# Altium footprint library ubloxLib.PcbLib: 20 footprints (part 1 of 2)
Each footprint in its own frame and in the unit in brackets; x right, y up, seen from the top. Pads: shape width x height; smd on the part's side, far side on the other; paste and mask are expansions set on the pad; w line width, h text height; cw(c..) or ccw(c..) is an arc to the next point about the centre after c.
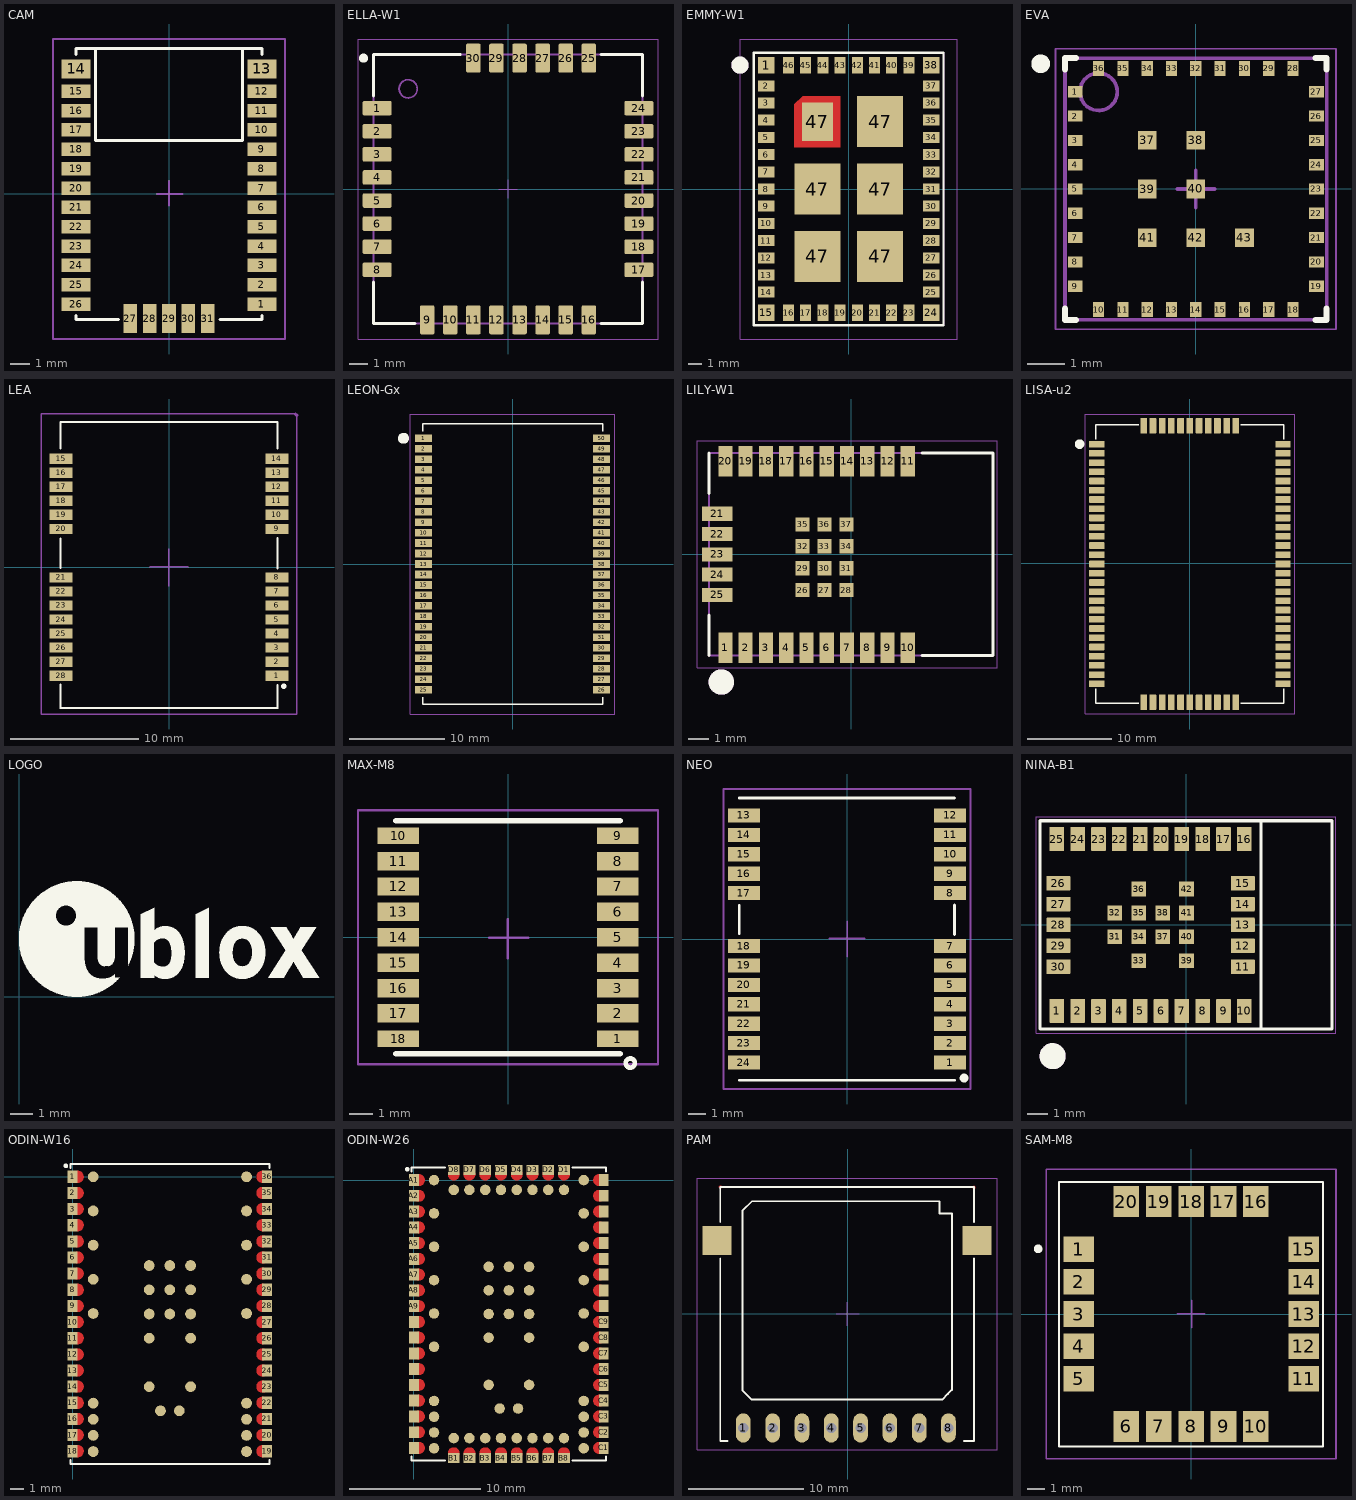
[diagram p0: the footprints below, top view; thin cyan lines are the x and y axes]

## CAM [mm] "u-blox CAM GNSS antenna module"
pads (31):
  rect 1.5x0.7 smd: 1(4.8,-5.7) 2(4.8,-4.7) 3(4.8,-3.7) 4(4.8,-2.7) 5(4.8,-1.7) 6(4.8,-0.7) 7(4.8,0.3) 8(4.8,1.3) 9(4.8,2.3) 10(4.8,3.3) 11(4.8,4.3) 12(4.8,5.3) 15(-4.8,5.3) 16(-4.8,4.3) 17(-4.8,3.3) 18(-4.8,2.3) 19(-4.8,1.3) 20(-4.8,0.3) 21(-4.8,-0.7) 22(-4.8,-1.7) 23(-4.8,-2.7) 24(-4.8,-3.7) 25(-4.8,-4.7) 26(-4.8,-5.7)
  rect 1.5x1 smd: 13(4.8,6.45) 14(-4.8,6.45)
  rect 0.7x1.5 smd: 27(-2,-6.45) 28(-1,-6.45) 29(0,-6.45) 30(1,-6.45) 31(2,-6.45)
Top Overlay:
  lines w0.16: -4.8,-6.3 -4.8,-6.5 -2.6,-6.5 ; -4.8,7.2 -4.8,7.5 4.8,7.5 4.8,7.2 ; -3.8,7.5 -3.8,2.75 3.8,2.75 3.8,7.5 ; 2.63,-6.5 4.45,-6.5 4.8,-6.5 4.8,-6.3
Mechanical 13:
  text ".Designator" at -3.818,9.56 h1
Mechanical 15:
  lines w0.1: -0.619,-0.003 -0.001,-0.003 ; -0.001,-0.615 -0.001,-0.003 ; -0.001,0.662 -0.001,-0.003 ; 0.696,-0.003 -0.001,-0.003 ; -6,-7.5 -6,8 6,8 6,-7.5 -6,-7.5
Multi-Layer:
  pour cut-out: -3.8,7.5 -3.8,2.75 3.8,2.75 3.8,7.5
3D body "CAM (STEP-AP214).STEP": height 1.97, standoff -0.04, extent -4.8,-6.5 4.8,7.5

## ELLA-W1 [mm] "IEEE 802.11a/b/g/n Wi-Fi, Bluetooth 3.0+HS Module"
height 2
pads (30):
  rrect25% 1.6x0.8 smd: 1(-7.2,4.445) 2(-7.2,3.175) 3(-7.2,1.905) 4(-7.2,0.635) 5(-7.2,-0.635) 6(-7.2,-1.905) 7(-7.2,-3.175) 8(-7.2,-4.445) 17(7.2,-4.445) 18(7.2,-3.175) 19(7.2,-1.905) 20(7.2,-0.635) 21(7.2,0.635) 22(7.2,1.905) 23(7.2,3.175) 24(7.2,4.445)
  rrect25% 0.8x1.6 smd: 9(-4.445,-7.2) 10(-3.175,-7.2) 11(-1.905,-7.2) 12(-0.635,-7.2) 13(0.635,-7.2) 14(1.905,-7.2) 15(3.175,-7.2) 16(4.445,-7.2) 25(4.445,7.2) 26(3.175,7.2) 27(1.905,7.2) 28(0.635,7.2) 29(-0.635,7.2) 30(-1.905,7.2)
Top Overlay:
  circle w0.4: c-7.95,7.2 r0.05
  lines w0.16: -7.4,-5.125 -7.4,-7.4 -5.125,-7.4 ; -7.4,5.125 -7.4,7.4 -2.625,7.4 ; 5.125,-7.4 7.4,-7.4 7.4,-5.125 ; 5.125,7.4 7.4,7.4 7.4,5.125
Mechanical 13:
  circle w0.1: c-5.489,5.512 r0.499
  lines w0.1: -7.4,4.695 -7.4,7.4 -2.155,7.4 ccw(c-1.905,7.4) -1.655,7.4 -0.885,7.4 ccw(c-0.635,7.4) -0.385,7.4 0.385,7.4 ccw(c0.635,7.4) 0.885,7.4 1.655,7.4 ccw(c1.905,7.4) 2.155,7.4 2.925,7.4 ccw(c3.175,7.4) 3.425,7.4 4.195,7.4 ccw(c4.445,7.4) 4.695,7.4 ; -7.4,4.695 cw(c-7.4,4.445) -7.4,4.195 -7.4,3.425 cw(c-7.4,3.175) -7.4,2.925 -7.4,2.155 cw(c-7.4,1.905) -7.4,1.655 -7.4,0.885 cw(c-7.4,0.635) -7.4,0.385 -7.4,-0.385 cw(c-7.4,-0.635) -7.4,-0.885 -7.4,-1.655 cw(c-7.4,-1.905) -7.4,-2.155 -7.4,-2.925 cw(c-7.4,-3.175) -7.4,-3.425 -7.4,-4.195 cw(c-7.4,-4.445) -7.4,-4.695 -7.4,-7.4 -4.695,-7.4 cw(c-4.445,-7.4) -4.195,-7.4 -3.425,-7.4 cw(c-3.175,-7.4) -2.925,-7.4 -2.155,-7.4 cw(c-1.905,-7.4) -1.655,-7.4 -0.885,-7.4 cw(c-0.635,-7.4) -0.385,-7.4 0.385,-7.4 cw(c0.635,-7.4) 0.885,-7.4 1.655,-7.4 cw(c1.905,-7.4) 2.155,-7.4 2.925,-7.4 cw(c3.175,-7.4) 3.425,-7.4 4.195,-7.4 cw(c4.445,-7.4) 4.695,-7.4 7.4,-7.4 7.4,-4.695 ; 4.694,7.4 7.4,7.4 7.4,4.695 ccw(c7.4,4.445) 7.4,4.195 7.4,3.425 ccw(c7.4,3.175) 7.4,2.925 7.4,2.155 ccw(c7.4,1.905) 7.4,1.655 7.4,0.885 ccw(c7.4,0.635) 7.4,0.385 7.4,-0.385 ccw(c7.4,-0.635) 7.4,-0.885 7.4,-1.655 ccw(c7.4,-1.905) 7.4,-2.155 7.4,-2.925 ccw(c7.4,-3.175) 7.4,-3.425 7.4,-4.195 ccw(c7.4,-4.445) 7.4,-4.695
  text ".Designator" at -7.4,8.7 h1
Mechanical 15:
  lines w0.05: -0.5,0 0.5,0 ; 0,-0.5 0,0.5 ; -8.25,-8.25 -8.25,8.25 8.25,8.25 8.25,-8.25 -8.25,-8.25
3D body: height 2.5, standoff 2.35, extent -7.2,-7.2 7.199,7.2
3D body: height 2.51, standoff 2.5, extent -5.999,5.01 -5.001,6.009
3D body: height 0.87, standoff 0.85, extent -7.3,6.1 -6.1,7.3
3D body: height 2.35, standoff 0.87, extent -7.1,6.2 -6.2,7.1
3D body: height 2.35, standoff 1.1, extent -6.15,7.05 6.15,7.2
3D body: height 2.35, standoff 0.87, extent 6.199,6.2 7.099,7.1
3D body: height 0.87, standoff 0.85, extent 6.099,6.1 7.299,7.3
3D body: height 2.35, standoff 0.87, extent 6.2,-7.1 7.1,-6.2
3D body: height 0.87, standoff 0.85, extent 6.1,-7.3 7.3,-6.1
3D body: height 2.35, standoff 0.87, extent -7.1,-7.1 -6.2,-6.2
3D body: height 0.87, standoff 0.85, extent -7.3,-7.3 -6.1,-6.1
3D body: height 2.35, standoff 1.1, extent -6.15,-7.2 6.15,-7.05
3D body: height 2.35, standoff 1.1, extent -7.2,-6.15 -7.05,6.15
3D body: height 2.35, standoff 1.1, extent 7.049,-6.15 7.199,6.15
3D body: height 0.85, standoff 0, extent -7.4,-7.4 7.4,7.4
3D body: height 0.87, standoff 0, extent -7.4,4.17 -7.125,4.72
3D body: height 0.87, standoff 0.85, extent -7.4,4.02 -6.975,4.87
3D body: height 0.87, standoff 0, extent -7.4,2.9 -7.125,3.45
3D body: height 0.87, standoff 0.85, extent -7.4,2.75 -6.975,3.6
3D body: height 0.87, standoff 0, extent -7.4,1.63 -7.125,2.18
3D body: height 0.87, standoff 0.85, extent -7.4,1.48 -6.975,2.33
3D body: height 0.87, standoff 0, extent -7.4,0.36 -7.125,0.91
3D body: height 0.87, standoff 0.85, extent -7.4,0.21 -6.975,1.06
3D body: height 0.87, standoff 0, extent -7.4,-0.91 -7.125,-0.36
3D body: height 0.87, standoff 0.85, extent -7.4,-1.06 -6.975,-0.21
3D body: height 0.87, standoff 0, extent -7.4,-2.18 -7.125,-1.63
3D body: height 0.87, standoff 0.85, extent -7.4,-2.33 -6.975,-1.48
3D body: height 0.87, standoff 0, extent -7.4,-3.45 -7.125,-2.9
3D body: height 0.87, standoff 0.85, extent -7.4,-3.6 -6.975,-2.75
3D body: height 0.87, standoff 0, extent -7.4,-4.72 -7.125,-4.17
3D body: height 0.87, standoff 0.85, extent -7.4,-4.87 -6.975,-4.02
3D body: height 0.87, standoff 0.85, extent 4.02,-7.4 4.87,-6.975
3D body: height 0.87, standoff 0, extent 4.17,-7.4 4.72,-7.125
3D body: height 0.87, standoff 0.85, extent 2.75,-7.4 3.6,-6.975
3D body: height 0.87, standoff 0, extent 2.9,-7.4 3.45,-7.125
3D body: height 0.87, standoff 0.85, extent 1.48,-7.4 2.33,-6.975
3D body: height 0.87, standoff 0, extent 1.63,-7.4 2.18,-7.125
3D body: height 0.87, standoff 0.85, extent 0.21,-7.4 1.06,-6.975
3D body: height 0.87, standoff 0, extent 0.36,-7.4 0.91,-7.125
3D body: height 0.87, standoff 0.85, extent -1.06,-7.4 -0.21,-6.975
3D body: height 0.87, standoff 0, extent -0.91,-7.4 -0.36,-7.125
3D body: height 0.87, standoff 0.85, extent -2.33,-7.4 -1.48,-6.975
3D body: height 0.87, standoff 0, extent -2.18,-7.4 -1.63,-7.125
3D body: height 0.87, standoff 0.85, extent -3.6,-7.4 -2.75,-6.975
3D body: height 0.87, standoff 0, extent -3.45,-7.4 -2.9,-7.125
3D body: height 0.87, standoff 0.85, extent -4.87,-7.4 -4.02,-6.975
3D body: height 0.87, standoff 0, extent -4.72,-7.4 -4.17,-7.125
3D body: height 0.87, standoff 0.85, extent 6.975,4.02 7.4,4.87
3D body: height 0.87, standoff 0, extent 7.125,4.17 7.4,4.72
3D body: height 0.87, standoff 0.85, extent 6.975,2.75 7.4,3.6
3D body: height 0.87, standoff 0, extent 7.125,2.9 7.4,3.45
3D body: height 0.87, standoff 0.85, extent 6.975,1.48 7.4,2.33
3D body: height 0.87, standoff 0, extent 7.125,1.63 7.4,2.18
3D body: height 0.87, standoff 0.85, extent 6.975,0.21 7.4,1.06
3D body: height 0.87, standoff 0, extent 7.125,0.36 7.4,0.91
3D body: height 0.87, standoff 0.85, extent 6.975,-1.06 7.4,-0.21
3D body: height 0.87, standoff 0, extent 7.125,-0.91 7.4,-0.36
3D body: height 0.87, standoff 0.85, extent 6.975,-2.33 7.4,-1.48
3D body: height 0.87, standoff 0, extent 7.125,-2.18 7.4,-1.63
3D body: height 0.87, standoff 0.85, extent 6.975,-3.6 7.4,-2.75
3D body: height 0.87, standoff 0, extent 7.125,-3.45 7.4,-2.9
3D body: height 0.87, standoff 0.85, extent 6.975,-4.87 7.4,-4.02
3D body: height 0.87, standoff 0, extent 7.125,-4.72 7.4,-4.17
3D body: height 0.87, standoff 0.85, extent -2.33,6.975 -1.48,7.4
3D body: height 0.87, standoff 0, extent -2.18,7.125 -1.63,7.4
3D body: height 0.87, standoff 0.85, extent -1.06,6.975 -0.21,7.4
3D body: height 0.87, standoff 0, extent -0.91,7.125 -0.36,7.4
3D body: height 0.87, standoff 0.85, extent 0.21,6.975 1.06,7.4
3D body: height 0.87, standoff 0, extent 0.36,7.125 0.91,7.4
3D body: height 0.87, standoff 0.85, extent 1.48,6.975 2.33,7.4
3D body: height 0.87, standoff 0, extent 1.63,7.125 2.18,7.4
3D body: height 0.87, standoff 0.85, extent 2.75,6.975 3.6,7.4
3D body: height 0.87, standoff 0, extent 2.9,7.125 3.45,7.4
3D body: height 0.87, standoff 0.85, extent 4.02,6.975 4.87,7.4
3D body: height 0.87, standoff 0, extent 4.17,7.125 4.72,7.4

## EMMY-W1 [mm] "Host-based multiradio module with Wi-Fi, Bluetooth and NFC"
height 2.5
pads (52):
  rect 1.2x1.2 smd: 1(-6,9) 15(-6,-9) 24(6,-9) 38(6,9)
  rect 1.2x0.8 smd: 2(-6,7.5) 3(-6,6.25) 4(-6,5) 5(-6,3.75) 6(-6,2.5) 7(-6,1.25) 8(-6,0) 9(-6,-1.25) 10(-6,-2.5) 11(-6,-3.75) 12(-6,-5) 13(-6,-6.25) 14(-6,-7.5) 25(6,-7.5) 26(6,-6.25) 27(6,-5) 28(6,-3.75) 29(6,-2.5) 30(6,-1.25) 31(6,0) 32(6,1.25) 33(6,2.5) 34(6,3.75) 35(6,5) 36(6,6.25) 37(6,7.5)
  rect 0.8x1.2 smd: 16(-4.375,-9) 17(-3.125,-9) 18(-1.875,-9) 19(-0.625,-9) 20(0.625,-9) 21(1.875,-9) 22(3.125,-9) 23(4.375,-9) 39(4.375,9) 40(3.125,9) 41(1.875,9) 42(0.625,9) 43(-0.625,9) 44(-1.875,9) 45(-3.125,9) 46(-4.375,9)
  rect 3.35x3.7 smd paste-10: 47(-2.275,-4.9) 47(-2.275,0) 47(2.275,-4.9) 47(2.275,0) 47(2.275,4.9)
  rect 2.25x2.8 smd paste-10: 47(-2.275,4.9)
Top Layer:
  region: -3.95,3.05 -0.6,3.05 -0.6,6.75 -3.35,6.75 -3.95,6.15
Top Overlay:
  circle w0.75: c-7.9,9 r0.25
  lines w0.15: -6.9,-9.9 -6.9,9.9 6.9,9.9 6.9,-9.9 -6.9,-9.9
Top Paste:
  drawing of 54 lines, arcs and shapes, not listed
Top Solder:
  region: -4.075,2.95 -0.5,2.95 -0.5,6.85 -3.425,6.85 -4.075,6.2
Mechanical 13:
  circle w0.75: c-7.9,9 r0.25
  lines w0.1: -6.9,-9.9 -6.9,9.9 6.9,9.9 6.9,-9.9 -6.9,-9.9
  text ".Designator" at -6.9,11.4 h1
Mechanical 15:
  lines w0.05: -7.9,-10.9 -7.9,10.9 7.9,10.9 7.9,-10.9 -7.9,-10.9
3D body: height 3, standoff 0, extent -6.925,-9.9 6.925,9.9

## EVA [mm] "u-blox EVA GNSS module"
height 1.16
pads (43):
  rect 0.4x0.3 smd: 1(-3.225,2.6) 2(-3.225,1.95) 3(-3.225,1.3) 4(-3.225,0.65) 5(-3.225,0) 6(-3.225,-0.65) 7(-3.225,-1.3) 8(-3.225,-1.95) 9(-3.225,-2.6) 19(3.225,-2.6) 20(3.225,-1.95) 21(3.225,-1.3) 22(3.225,-0.65) 23(3.225,0) 24(3.225,0.65) 25(3.225,1.3) 26(3.225,1.95) 27(3.225,2.6)
  rect 0.3x0.4 smd: 10(-2.6,-3.225) 11(-1.95,-3.225) 12(-1.3,-3.225) 13(-0.65,-3.225) 14(0,-3.225) 15(0.65,-3.225) 16(1.3,-3.225) 17(1.95,-3.225) 18(2.6,-3.225) 28(2.6,3.225) 29(1.95,3.225) 30(1.3,3.225) 31(0.65,3.225) 32(0,3.225) 33(-0.65,3.225) 34(-1.3,3.225) 35(-1.95,3.225) 36(-2.6,3.225)
  rect 0.5x0.5 smd paste+0: 37(-1.3,1.3) 38(0,1.3) 39(-1.3,0) 40(0,0) 41(-1.3,-1.3) 42(0,-1.3) 43(1.3,-1.3)
Top Overlay:
  circle w0.25: c-4.15,3.35 r0.125
  lines w0.16: -3.5,-3.2 -3.5,-3.5 -3.2,-3.5 ; -3.5,3.2 -3.5,3.5 -3.2,3.5 ; 3.2,-3.5 3.5,-3.5 3.5,-3.2 ; 3.2,3.5 3.5,3.5 3.5,3.2
Mechanical 13:
  circle w0.1: c-2.6,2.6 r0.5
  lines w0.1: -3.5,-3.5 -3.5,3.5 3.5,3.5 3.5,-3.5 -3.5,-3.5
  text ".Designator" at -3.291,4.285 h1
Mechanical 15:
  lines w0.05: -3.75,-3.75 -3.75,3.75 3.75,3.75 3.75,-3.75 -3.75,-3.75
  lines w0.1: -0.5,0 0.5,0 ; 0,-0.5 0,0.5
3D body "EVA-43 (STEP-AP214).STEP": height 1.07, standoff 0.01, extent -3.499,-3.499 3.501,3.501

## LEA [mm] "u-blox LEA GNSS module"
pads (28):
  rect 1.8x0.8 smd paste-4: 1(8.445,-8.5)
  rect 1.8x0.8 smd paste-0.4 mask+0.102: 2(8.445,-7.4) 3(8.445,-6.3) 4(8.445,-5.2) 5(8.445,-4.1) 6(8.445,-3) 7(8.445,-1.9) 8(8.445,-0.8) 9(8.445,3) 10(8.445,4.1) 11(8.445,5.2) 12(8.445,6.3) 13(8.445,7.4) 14(8.445,8.5) 16(-8.445,7.4) 17(-8.445,6.3) 18(-8.445,5.2) 19(-8.445,4.1) 20(-8.445,3) 21(-8.445,-0.8) 22(-8.445,-1.9) 23(-8.445,-3) 24(-8.445,-4.1) 25(-8.445,-5.2) 26(-8.445,-6.3) 27(-8.445,-7.4) 28(-8.445,-8.5)
  rect 1.8x0.8 smd paste-0.4: 15(-8.445,8.5)
Top Overlay:
  circle w0.38: c8.999,-9.325 r0.026
  lines w0.16: -8.514,9.28 -8.514,11.344 -8.495,11.363 8.497,11.363 8.497,9.28 ; -8.508,-0.08 -8.508,2.238 ; -8.501,-9.198 -8.501,-11.027 -8.489,-11.04 8.485,-11.04 8.497,-11.027 8.497,-9.237 ; 8.485,-0.093 8.485,2.276
Top Paste:
  rectangle: 8.496,-8.9 9.596,-8.1
  rectangle: 8.496,-7.8 9.596,-7
  rectangle: 8.496,-6.7 9.596,-5.9
  rectangle: 8.496,-5.6 9.596,-4.8
  rectangle: 8.496,-4.5 9.596,-3.7
  rectangle: 8.496,-3.4 9.596,-2.6
  rectangle: 8.496,-2.3 9.596,-1.5
  rectangle: 8.496,-1.2 9.596,-0.4
  rectangle: 8.495,2.6 9.596,3.4
  rectangle: 8.495,3.7 9.596,4.5
  rectangle: 8.495,5.9 9.596,6.7
  rectangle: 8.495,7 9.596,7.8
  rectangle: 8.495,8.1 9.596,8.9
  rectangle: 8.495,4.8 9.596,5.6
  rectangle: 7.845,-8.8 8.495,-8.2
  rectangle: 7.845,-6.6 8.495,-6
  rectangle: 7.845,-5.5 8.495,-4.9
  rectangle: 7.845,-4.4 8.495,-3.8
  rectangle: 7.845,-3.3 8.495,-2.7
  rectangle: 7.845,-2.2 8.495,-1.6
  rectangle: 7.845,-1.1 8.495,-0.5
  rectangle: 7.845,2.7 8.495,3.3
  rectangle: 7.845,3.8 8.495,4.4
  rectangle: 7.845,4.9 8.495,5.5
  rectangle: 7.845,6 8.495,6.6
  rectangle: 7.845,8.2 8.495,8.8
  rectangle: 7.845,7.1 8.495,7.7
  rectangle: 7.845,-7.7 8.495,-7.1
  rectangle: -9.604,4.8 -8.504,5.6
  rectangle: -9.604,8.1 -8.504,8.9
  rectangle: -9.604,7 -8.504,7.8
  rectangle: -9.604,5.9 -8.504,6.7
  rectangle: -9.604,3.7 -8.504,4.5
  rectangle: -9.604,2.6 -8.504,3.4
  rectangle: -8.504,7.1 -7.854,7.7
  rectangle: -8.504,8.2 -7.854,8.8
  rectangle: -8.504,6 -7.854,6.6
  rectangle: -8.504,4.9 -7.854,5.5
  rectangle: -8.504,3.8 -7.854,4.4
  rectangle: -8.504,2.7 -7.854,3.3
  rectangle: -9.604,-1.2 -8.504,-0.4
  rectangle: -9.604,-2.3 -8.504,-1.5
  rectangle: -9.604,-3.4 -8.504,-2.6
  rectangle: -9.604,-4.5 -8.504,-3.7
  rectangle: -9.604,-5.6 -8.504,-4.8
  rectangle: -9.604,-6.7 -8.504,-5.9
  rectangle: -9.604,-7.8 -8.504,-7
  rectangle: -9.604,-8.9 -8.504,-8.1
  rectangle: -8.505,-7.7 -7.855,-7.1
  rectangle: -8.505,-1.1 -7.855,-0.5
  rectangle: -8.505,-2.2 -7.855,-1.6
  rectangle: -8.505,-3.3 -7.855,-2.7
  rectangle: -8.505,-4.4 -7.855,-3.8
  rectangle: -8.505,-5.5 -7.855,-4.9
  rectangle: -8.505,-6.6 -7.855,-6
  rectangle: -8.505,-8.8 -7.855,-8.2
Mechanical 13:
  text ".Designator" at -6.65,12.659 h1
Mechanical 15:
  lines w0.1: -1.5,0.019 -0.001,0.019 ; -0.001,-1.5 -0.001,0.019 ; -0.001,1.464 -0.001,0.019 ; 1.5,0.019 -0.001,0.019 ; 9.9,12 -10,12 -10,-11.5 10,-11.5 10,11.9
  lines w0.254: 9.9,12 10,11.9
3D body "LEA ( STEP-AP214).STEP": height 2.35, standoff -0.05, extent -8.502,-11.015 8.498,11.385

## LEON-Gx [mm] "quad-band GSM/GPRS data & voice module"
height 3.3
pads (50):
  rrect5% 1.8x0.8 smd paste-1: 1(-9.35,13.2) 2(-9.35,12.1) 3(-9.35,11) 4(-9.35,9.9) 5(-9.35,8.8) 6(-9.35,7.7) 7(-9.35,6.6) 8(-9.35,5.5) 9(-9.35,4.4) 10(-9.35,3.3) 11(-9.35,2.2) 12(-9.35,1.1) 13(-9.35,0) 14(-9.35,-1.1) 15(-9.35,-2.2) 16(-9.35,-3.3) 17(-9.35,-4.4) 18(-9.35,-5.5) 19(-9.35,-6.6) 20(-9.35,-7.7) 21(-9.35,-8.8) 22(-9.35,-9.9) 23(-9.35,-11) 24(-9.35,-12.1) 25(-9.35,-13.2) 26(9.35,-13.2) 27(9.35,-12.1) 28(9.35,-11) 29(9.35,-9.9) 30(9.35,-8.8) 31(9.35,-7.7) 32(9.35,-6.6) 33(9.35,-5.5) 34(9.35,-4.4) 35(9.35,-3.3) 36(9.35,-2.2) 37(9.35,-1.1) 38(9.35,0) 39(9.35,1.1) 40(9.35,2.2) 41(9.35,3.3) 42(9.35,4.4) 43(9.35,5.5) 44(9.35,6.6) 45(9.35,7.7) 46(9.35,8.8) 47(9.35,9.9) 48(9.35,11) 49(9.35,12.1) 50(9.35,13.2)
Top Overlay:
  circle w0.635: c-11.454,13.2 r0.254
  lines w0.15: -9.45,-14 -9.45,-14.75 9.45,-14.75 9.45,-14 ; -9.45,13.95 -9.45,14.75 9.45,14.75 9.45,13.95
Top Paste:
  rectangle: -10.65,12.8 -9.45,13.6
  rectangle: 9.45,12.8 10.65,13.6
  rectangle: -10.65,11.7 -9.45,12.5
  rectangle: -10.65,10.6 -9.45,11.4
  rectangle: -10.65,9.5 -9.45,10.3
  rectangle: -10.65,8.4 -9.45,9.2
  rectangle: -10.65,7.3 -9.45,8.1
  rectangle: -10.65,6.2 -9.45,7
  rectangle: -10.65,5.1 -9.45,5.9
  rectangle: -10.65,4 -9.45,4.8
  rectangle: -10.65,2.9 -9.45,3.7
  rectangle: -10.65,1.8 -9.45,2.6
  rectangle: -10.65,0.7 -9.45,1.5
  rectangle: -10.65,-0.4 -9.45,0.4
  rectangle: -10.65,-1.5 -9.45,-0.7
  rectangle: -10.65,-2.6 -9.45,-1.8
  rectangle: -10.65,-3.7 -9.45,-2.9
  rectangle: -10.65,-4.8 -9.45,-4
  rectangle: -10.65,-5.9 -9.45,-5.1
  rectangle: -10.65,-7 -9.45,-6.2
  rectangle: -10.65,-13.6 -9.45,-12.8
  rectangle: -10.65,-12.5 -9.45,-11.7
  rectangle: -10.65,-11.4 -9.45,-10.6
  rectangle: -10.65,-10.3 -9.45,-9.5
  rectangle: -10.65,-9.2 -9.45,-8.4
  rectangle: -10.65,-8.1 -9.45,-7.3
  rectangle: 9.45,-13.6 10.65,-12.8
  rectangle: 9.45,-12.5 10.65,-11.7
  rectangle: 9.45,-11.4 10.65,-10.6
  rectangle: 9.45,-10.3 10.65,-9.5
  rectangle: 9.45,-9.2 10.65,-8.4
  rectangle: 9.45,-8.1 10.65,-7.3
  rectangle: 9.45,-7 10.65,-6.2
  rectangle: 9.45,-5.9 10.65,-5.1
  rectangle: 9.45,-4.8 10.65,-4
  rectangle: 9.45,-3.7 10.65,-2.9
  rectangle: 9.45,-2.6 10.65,-1.8
  rectangle: 9.45,-1.5 10.65,-0.7
  rectangle: 9.45,-0.4 10.65,0.4
  rectangle: 9.45,0.7 10.65,1.5
  rectangle: 9.45,1.8 10.65,2.6
  rectangle: 9.45,2.9 10.65,3.7
  rectangle: 9.45,4 10.65,4.8
  rectangle: 9.45,5.1 10.65,5.9
  rectangle: 9.45,6.2 10.65,7
  rectangle: 9.45,7.3 10.65,8.1
  rectangle: 9.45,8.4 10.65,9.2
  rectangle: 9.45,9.5 10.65,10.3
  rectangle: 9.45,10.6 10.65,11.4
  rectangle: 9.45,11.7 10.65,12.5
  rectangle: -9.45,12.9 -8.55,13.5
  rectangle: -9.45,10.7 -8.55,11.3
  rectangle: -9.45,11.8 -8.55,12.4
  rectangle: -9.45,9.6 -8.55,10.2
  rectangle: -9.45,5.2 -8.55,5.8
  rectangle: -9.45,7.4 -8.55,8
  rectangle: -9.45,6.3 -8.55,6.9
  rectangle: -9.45,8.5 -8.55,9.1
  rectangle: -9.45,0.8 -8.55,1.4
  rectangle: -9.45,3 -8.55,3.6
  rectangle: -9.45,1.9 -8.55,2.5
  rectangle: -9.45,4.1 -8.55,4.7
  rectangle: -9.45,-3.6 -8.55,-3
  rectangle: -9.45,-1.4 -8.55,-0.8
  rectangle: -9.45,-2.5 -8.55,-1.9
  rectangle: -9.45,-0.3 -8.55,0.3
  rectangle: -9.45,-8 -8.55,-7.4
  rectangle: -9.45,-5.8 -8.55,-5.2
  rectangle: -9.45,-6.9 -8.55,-6.3
  rectangle: -9.45,-4.7 -8.55,-4.1
  rectangle: -9.45,-12.4 -8.55,-11.8
  rectangle: -9.45,-10.2 -8.55,-9.6
  rectangle: -9.45,-11.3 -8.55,-10.7
  rectangle: -9.45,-9.1 -8.55,-8.5
  rectangle: -9.45,-13.5 -8.55,-12.9
  rectangle: 8.55,-13.5 9.45,-12.9
  rectangle: 8.55,-11.3 9.45,-10.7
  rectangle: 8.55,-12.4 9.45,-11.8
  rectangle: 8.55,-10.2 9.45,-9.6
  rectangle: 8.55,-9.1 9.45,-8.5
  rectangle: 8.55,-6.9 9.45,-6.3
  rectangle: 8.55,-8 9.45,-7.4
  rectangle: 8.55,-5.8 9.45,-5.2
  rectangle: 8.55,-4.7 9.45,-4.1
  rectangle: 8.55,-2.5 9.45,-1.9
  rectangle: 8.55,-3.6 9.45,-3
  rectangle: 8.55,-1.4 9.45,-0.8
  rectangle: 8.55,-0.3 9.45,0.3
  rectangle: 8.55,1.9 9.45,2.5
  rectangle: 8.55,0.8 9.45,1.4
  rectangle: 8.55,3 9.45,3.6
  rectangle: 8.55,4.1 9.45,4.7
  rectangle: 8.55,6.3 9.45,6.9
  rectangle: 8.55,5.2 9.45,5.8
  rectangle: 8.55,7.4 9.45,8
  rectangle: 8.55,8.5 9.45,9.1
  rectangle: 8.55,10.7 9.45,11.3
  rectangle: 8.55,9.6 9.45,10.2
  rectangle: 8.55,11.8 9.45,12.4
  rectangle: 8.55,12.9 9.45,13.5
Mechanical 13:
  text ".Designator" at -9.45,16.25 h1
Mechanical 15:
  lines w0.05: -10.75,-15.75 10.75,-15.75 10.75,15.75 -10.75,15.75 -10.75,-15.75
3D body: height 3.3, standoff 3.2, extent -8.575,-13.825 8.575,13.875
3D body: height 0.9, standoff 0, extent -9.45,-14.75 9.45,14.75
3D body: height 3.2, standoff 0.9, extent -8.95,-14.2 8.95,14.25

## LILY-W1 [mm] "Host-based Wi-Fi module"
height 4.14
pads (37):
  rect 0.7x1.5 smd paste+0 mask+0.05: 1(-6.2,-4.6) 2(-5.2,-4.6) 3(-4.2,-4.6) 4(-3.2,-4.6) 5(-2.2,-4.6) 6(-1.2,-4.6) 7(-0.2,-4.6) 8(0.8,-4.6) 9(1.8,-4.6) 10(2.8,-4.6) 11(2.8,4.6) 12(1.8,4.6) 13(0.8,4.6) 14(-0.2,4.6) 15(-1.2,4.6) 16(-2.2,4.6) 17(-3.2,4.6) 18(-4.2,4.6) 19(-5.2,4.6) 20(-6.2,4.6)
  rect 1.5x0.7 smd paste+0 mask+0.05: 21(-6.6,2) 22(-6.6,1) 23(-6.6,0) 24(-6.6,-1) 25(-6.6,-2)
  rect 0.7x0.7 smd paste+0 mask+0.05: 26(-2.39,-1.76) 27(-1.31,-1.76) 28(-0.23,-1.76) 29(-2.39,-0.68) 30(-1.31,-0.68) 31(-0.23,-0.68) 32(-2.39,0.4) 33(-1.31,0.4) 34(-0.23,0.4) 35(-2.39,1.48) 36(-1.31,1.48) 37(-0.23,1.48)
Top Overlay:
  circle w0.75: c-6.4,-6.3 r0.25
  lines w0.15: -7,-5 -7,-3 ; -7,3 -7,5 ; 3.5,-5 7,-5 7,5 3.5,5
Mechanical 13:
  circle w0.75: c-6.4,-6.3 r0.25
  lines w0.1: -7,-5 -7,5 7,5 7,-5 -7,-5
  text ".Designator" at -7,6 h1
Mechanical 15:
  lines w0.05: -7.6,-5.6 -7.6,5.6 7.2,5.6 7.2,-5.6 -7.6,-5.6
3D body: height 2.54, standoff 0.05, extent -7,-5 3.2,5
3D body: height 4.14, standoff 0, extent 3.2,-5 7,5

## LISA-u2 [mm] "3.75G HSPA+ Cellular Module"
height 2.87
pads (76):
  rrect7% 1.8x0.8 smd paste-10: 1(-11.1,14.2) 2(-11.1,13.1) 3(-11.1,12) 4(-11.1,10.9) 5(-11.1,9.8) 6(-11.1,8.7) 7(-11.1,7.6) 8(-11.1,6.5) 9(-11.1,5.4) 10(-11.1,4.3) 11(-11.1,3.2) 12(-11.1,2.1) 13(-11.1,1) 14(-11.1,-0.1) 15(-11.1,-1.2) 16(-11.1,-2.3) 17(-11.1,-3.4) 18(-11.1,-4.5) 19(-11.1,-5.6) 20(-11.1,-6.7) 21(-11.1,-7.8) 22(-11.1,-8.9) 23(-11.1,-10) 24(-11.1,-11.1) 25(-11.1,-12.2) 26(-11.1,-13.3) 27(-11.1,-14.4) 39(11.1,-14.4) 40(11.1,-13.3) 41(11.1,-12.2) 42(11.1,-11.1) 43(11.1,-10) 44(11.1,-8.9) 45(11.1,-7.8) 46(11.1,-6.7) 47(11.1,-5.6) 48(11.1,-4.5) 49(11.1,-3.4) 50(11.1,-2.3) 51(11.1,-1.2) 52(11.1,-0.1) 53(11.1,1) 54(11.1,2.1) 55(11.1,3.2) 56(11.1,4.3) 57(11.1,5.4) 58(11.1,6.5) 59(11.1,7.6) 60(11.1,8.7) 61(11.1,9.8) 62(11.1,10.9) 63(11.1,12) 64(11.1,13.1) 65(11.1,14.2)
  rrect7% 0.8x1.8 smd paste-10: 28(-5.5,-16.6) 29(-4.4,-16.6) 30(-3.3,-16.6) 31(-2.2,-16.6) 32(-1.1,-16.6) 33(0,-16.6) 34(1.1,-16.6) 35(2.2,-16.6) 36(3.3,-16.6) 37(4.4,-16.6) 38(5.5,-16.6) 66(5.5,16.4) 67(4.4,16.4) 68(3.3,16.4) 69(2.2,16.4) 70(1.1,16.4) 71(0,16.4) 72(-1.1,16.4) 73(-2.2,16.4) 74(-3.3,16.4) 75(-4.4,16.4) 76(-5.5,16.4)
Top Overlay:
  circle w0.635: c-13.154,14.2 r0.254
  lines w0.15: -11.2,-15 -11.2,-16.7 -6.1,-16.7 ; -11.2,14.8 -11.2,16.5 -6.1,16.5 ; 6.1,-16.7 11.2,-16.7 11.2,-15 ; 6.1,16.5 11.2,16.5 11.2,14.8
Top Paste:
  drawing of 152 lines, arcs and shapes, not listed
Mechanical 13:
  text ".Designator" at -12.1,18.3 h1
Mechanical 15:
  lines w0.05: -12.5,-18 -12.5,17.8 12.5,17.8 12.5,-18 -12.5,-18
3D body: height 2.87, standoff 0, extent -11.2,-16.7 11.2,16.5

## LOGO [mm] "u-blox logo"
Top Overlay:
  drawing of 5 lines, arcs and shapes, not listed

## MAX-M8 [mm] "u-blox M8 concurrent GNSS modules"
height 2.7
pads (18):
  rect 1.8x0.7 smd paste-10: 1(4.75,-4.4) 9(4.75,4.4) 10(-4.75,4.4) 18(-4.75,-4.4)
  rect 1.8x0.8 smd paste-10: 2(4.75,-3.3) 3(4.75,-2.2) 4(4.75,-1.1) 5(4.75,0) 6(4.75,1.1) 7(4.75,2.2) 8(4.75,3.3) 11(-4.75,3.3) 12(-4.75,2.2) 13(-4.75,1.1) 14(-4.75,0) 15(-4.75,-1.1) 16(-4.75,-2.2) 17(-4.75,-3.3)
Top Overlay:
  circle w0.2: c5.3,-5.45 r0.2
  lines w0.254: -4.85,-5.05 4.85,-5.05 ; -4.85,5.05 4.85,5.05
Top Paste:
  region: -6.25,4.75 -6.25,4.05 -4.85,4.05 -4.85,4.15 -3.95,4.15 -3.95,4.65 -4.85,4.65 -4.85,4.75
  region: 6.25,4.05 6.25,4.75 4.85,4.75 4.85,4.65 3.95,4.65 3.95,4.15 4.85,4.15 4.85,4.05
  region: 6.25,-4.75 6.25,-4.05 4.85,-4.05 4.85,-4.15 3.95,-4.15 3.95,-4.65 4.85,-4.65 4.85,-4.75
  region: -6.25,-4.05 -6.25,-4.75 -4.85,-4.75 -4.85,-4.65 -3.95,-4.65 -3.95,-4.15 -4.85,-4.15 -4.85,-4.05
  region: -6.25,3.7 -6.25,2.9 -4.85,2.9 -4.85,3 -3.95,3 -3.95,3.6 -4.85,3.6 -4.85,3.7
  region: -6.25,2.6 -6.25,1.8 -4.85,1.8 -4.85,1.9 -3.95,1.9 -3.95,2.5 -4.85,2.5 -4.85,2.6
  region: -6.25,1.5 -6.25,0.7 -4.85,0.7 -4.85,0.8 -3.95,0.8 -3.95,1.4 -4.85,1.4 -4.85,1.5
  region: -6.25,0.4 -6.25,-0.4 -4.85,-0.4 -4.85,-0.3 -3.95,-0.3 -3.95,0.3 -4.85,0.3 -4.85,0.4
  region: -6.25,-0.7 -6.25,-1.5 -4.85,-1.5 -4.85,-1.4 -3.95,-1.4 -3.95,-0.8 -4.85,-0.8 -4.85,-0.7
  region: -6.25,-1.8 -6.25,-2.6 -4.85,-2.6 -4.85,-2.5 -3.95,-2.5 -3.95,-1.9 -4.85,-1.9 -4.85,-1.8
  region: -6.25,-2.9 -6.25,-3.7 -4.85,-3.7 -4.85,-3.6 -3.95,-3.6 -3.95,-3 -4.85,-3 -4.85,-2.9
  region: 6.25,-3.7 6.25,-2.9 4.85,-2.9 4.85,-3 3.95,-3 3.95,-3.6 4.85,-3.6 4.85,-3.7
  region: 6.25,-2.6 6.25,-1.8 4.85,-1.8 4.85,-1.9 3.95,-1.9 3.95,-2.5 4.85,-2.5 4.85,-2.6
  region: 6.25,-1.5 6.25,-0.7 4.85,-0.7 4.85,-0.8 3.95,-0.8 3.95,-1.4 4.85,-1.4 4.85,-1.5
  region: 6.25,-0.4 6.25,0.4 4.85,0.4 4.85,0.3 3.95,0.3 3.95,-0.3 4.85,-0.3 4.85,-0.4
  region: 6.25,0.7 6.25,1.5 4.85,1.5 4.85,1.4 3.95,1.4 3.95,0.8 4.85,0.8 4.85,0.7
  region: 6.25,1.8 6.25,2.6 4.85,2.6 4.85,2.5 3.95,2.5 3.95,1.9 4.85,1.9 4.85,1.8
  region: 6.25,2.9 6.25,3.7 4.85,3.7 4.85,3.6 3.95,3.6 3.95,3 4.85,3 4.85,2.9
Mechanical 13:
  text ".Designator" at -3.942,6.973 h1
Mechanical 15:
  lines w0.1: -0.822,-0.023 -0.007,-0.023 ; -0.007,-0.918 -0.007,-0.023 ; -0.007,0.775 -0.007,-0.023 ; 0.871,-0.023 -0.007,-0.023 ; -6.5,-5.5 -6.5,5.5 6.5,5.5 6.5,-5.5 -6.5,-5.5
3D body: height 2.7, standoff 0, extent -4.851,-5.05 4.849,5.05

## NEO [mm] "u-blox NEO GNSS module"
pads (24):
  rect 1.8x0.8 smd paste-0.1: 1(5.842,-7) 2(5.842,-5.9) 3(5.842,-4.8) 4(5.842,-3.7) 5(5.842,-2.6) 6(5.842,-1.5) 7(5.842,-0.4) 8(5.842,2.6) 9(5.842,3.7) 10(5.842,4.8) 11(5.842,5.9) 12(5.842,7) 13(-5.842,7) 14(-5.842,5.9) 15(-5.842,4.8) 16(-5.842,3.7) 17(-5.842,2.6) 18(-5.842,-0.4) 19(-5.842,-1.5) 20(-5.842,-2.6) 21(-5.842,-3.7) 22(-5.842,-4.8) 23(-5.842,-5.9) 24(-5.842,-7)
Top Overlay:
  circle w0.38: c6.636,-7.879 r0.058
  lines w0.16: -6.109,-8 6.096,-8 ; -6.109,7.996 6.09,7.996 ; -6.102,0.299 -6.102,1.893 ; 6.096,0.255 6.096,1.919
Top Paste:
  rectangle: -6.833,-4.1 -5.633,-3.3
  rectangle: -6.833,-7.4 -5.633,-6.6
  rectangle: -6.833,-6.3 -5.633,-5.5
  rectangle: -6.833,-5.2 -5.633,-4.4
  rectangle: -6.833,-3 -5.633,-2.2
  rectangle: -6.833,-1.9 -5.633,-1.1
  rectangle: -6.833,-0.8 -5.633,0
  rectangle: -6.833,2.2 -5.633,3
  rectangle: -6.833,3.3 -5.633,4.1
  rectangle: -6.833,4.4 -5.633,5.2
  rectangle: -6.833,5.5 -5.633,6.3
  rectangle: -6.833,6.6 -5.633,7.4
  rectangle: 5.642,6.6 6.842,7.4
  rectangle: 5.642,5.5 6.842,6.3
  rectangle: 5.642,4.4 6.842,5.2
  rectangle: 5.642,3.3 6.842,4.1
  rectangle: 5.642,2.2 6.842,3
  rectangle: 5.642,-0.8 6.842,0
  rectangle: 5.642,-1.9 6.842,-1.1
  rectangle: 5.642,-3 6.842,-2.2
  rectangle: 5.642,-4.1 6.842,-3.3
  rectangle: 5.642,-5.2 6.842,-4.4
  rectangle: 5.642,-6.3 6.842,-5.5
  rectangle: 5.642,-7.4 6.842,-6.6
Mechanical 13:
  text ".Designator" at -5.585,9.867 h1
Mechanical 15:
  lines w0.1: -1,0.024 0.02,0.024 ; 0.02,-1 0.02,0.024 ; 0.02,1 0.02,0.024 ; 1,0.024 0.02,0.024 ; -7,-8.5 -7,8.5 7,8.5 7,-8.5 -7,-8.5
3D body "NEO (STEP-AP214)_B.STEP": height 2.28, standoff -0.05, extent -6.104,-8 6.096,8

## NINA-B1 [mm] "Stand-alone Bluetooth low energy module"
height 4.14
pads (42):
  rrect10% 0.7x1.15 smd paste+0 mask+0.05: 1(-6.2,-4.125) 2(-5.2,-4.125) 3(-4.2,-4.125) 4(-3.2,-4.125) 5(-2.2,-4.125) 6(-1.2,-4.125) 7(-0.2,-4.125) 8(0.8,-4.125) 9(1.8,-4.125) 10(2.8,-4.125) 16(2.8,4.125) 17(1.8,4.125) 18(0.8,4.125) 19(-0.2,4.125) 20(-1.2,4.125) 21(-2.2,4.125) 22(-3.2,4.125) 23(-4.2,4.125) 24(-5.2,4.125) 25(-6.2,4.125)
  rrect10% 1.15x0.7 smd paste+0 mask+0.05: 11(2.725,-2) 12(2.725,-1) 13(2.725,0) 14(2.725,1) 15(2.725,2) 26(-6.125,2) 27(-6.125,1) 28(-6.125,0) 29(-6.125,-1) 30(-6.125,-2)
  rect 0.7x0.7 smd paste+0 mask+0.05: 31(-3.425,-0.575) 32(-3.425,0.575) 33(-2.275,-1.725) 34(-2.275,-0.575) 35(-2.275,0.575) 36(-2.275,1.725) 37(-1.125,-0.575) 38(-1.125,0.575) 39(0.025,-1.725) 40(0.025,-0.575) 41(0.025,0.575) 42(0.025,1.725)
Top Overlay:
  circle w0.75: c-6.4,-6.3 r0.25
  lines w0.15: 3.6,-5 3.6,5 ; -7,-5 7,-5 7,5 -7,5 -7,-5
Mechanical 13:
  circle w0.75: c-6.4,-6.3 r0.25
  lines w0.1: -7,-5 7,-5 7,5 -7,5 -7,-5
  text ".Designator" at -7,6 h1
Mechanical 15:
  lines w0.05: -7.2,-5.2 7.2,-5.2 7.2,5.2 -7.2,5.2 -7.2,-5.2
3D body: height 4.1, standoff 0, extent 3.6,-5 7,5
3D body: height 2.5, standoff 0.05, extent -7,-5 3.6,5

## ODIN-W16 [mm] "ODIN-W16 WiFi/BT module"
pads (69):
  rect 0.75x0.9 smd mask+0.05: 1(0,0) 2(0,-1.2) 3(0,-2.4) 4(0,-3.6) 5(0,-4.8) 6(0,-6) 7(0,-7.2) 8(0,-8.4) 9(0,-9.6) 10(0,-10.8) 11(0,-12) 12(0,-13.2) 13(0,-14.4) 14(0,-15.6) 15(0,-16.8) 16(0,-18) 17(0,-19.2) 18(0,-20.4) 19(14.45,-20.4) 20(14.45,-19.2) 21(14.45,-18) 22(14.45,-16.8) 23(14.45,-15.6) 24(14.45,-14.4) 25(14.45,-13.2) 26(14.45,-12) 27(14.45,-10.8) 28(14.45,-9.6) 29(14.45,-8.4) 30(14.45,-7.2) 31(14.45,-6) 32(14.45,-4.8) 33(14.45,-3.6) 34(14.45,-2.4) 35(14.45,-1.2) 36(14.45,0)
  round 0.8 smd mask+0.05: GND(5.685,-15.6) GND(5.685,-12) GND(5.685,-10.2) GND(5.685,-8.4) GND(5.685,-6.6) GND(6.525,-17.4) GND(7.225,-10.2) GND(7.225,-8.4) GND(7.225,-6.6) GND(7.925,-17.4) GND(8.765,-15.6) GND(8.765,-12) GND(8.765,-10.2) GND(8.765,-8.4) GND(8.765,-6.6) GND(12.925,-20.425) GND(12.925,-19.225) GND(12.925,-18.025) GND(12.925,-16.825) NC1(1.525,-20.425) NC2(1.525,-19.225) NC3(1.525,-18.025) NC4(1.525,-16.825) TP1(1.525,-10.16) TP2(12.925,-10.16) TP3(1.525,-7.62) TP4(12.925,-7.62) TP5(1.525,-5.08) TP6(12.925,-5.08) TP7(1.525,-2.54) TP8(12.925,-2.54) TP9(1.525,0) TP10(12.925,0)
Top Layer:
  circle w0.45: c0.375,0 r0.225
  circle w0.45: c0.375,-1.2 r0.225
  circle w0.45: c0.375,-2.4 r0.225
  circle w0.45: c0.375,-3.6 r0.225
  circle w0.45: c0.375,-4.8 r0.225
  circle w0.45: c0.375,-6 r0.225
  circle w0.45: c0.375,-7.2 r0.225
  circle w0.45: c0.375,-8.4 r0.225
  circle w0.45: c0.375,-9.6 r0.225
  circle w0.45: c0.375,-10.8 r0.225
  circle w0.45: c0.375,-12 r0.225
  circle w0.45: c0.375,-13.2 r0.225
  circle w0.45: c0.375,-14.4 r0.225
  circle w0.45: c0.375,-15.6 r0.225
  circle w0.45: c0.375,-16.8 r0.225
  circle w0.45: c0.375,-18 r0.225
  circle w0.45: c0.375,-19.2 r0.225
  circle w0.45: c0.375,-20.4 r0.225
  circle w0.45: c14.1,-20.4 r0.225
  circle w0.45: c14.1,-19.2 r0.225
  circle w0.45: c14.1,-18 r0.225
  circle w0.45: c14.1,-16.8 r0.225
  circle w0.45: c14.1,-15.6 r0.225
  circle w0.45: c14.1,-14.4 r0.225
  circle w0.45: c14.1,-13.2 r0.225
  circle w0.45: c14.1,-10.8 r0.225
  circle w0.45: c14.1,-9.6 r0.225
  circle w0.45: c14.1,-8.4 r0.225
  circle w0.45: c14.1,-7.2 r0.225
  circle w0.45: c14.1,0 r0.225
  circle w0.45: c14.1,-1.2 r0.225
  circle w0.45: c14.1,-2.4 r0.225
  circle w0.45: c14.1,-6 r0.225
  circle w0.45: c14.1,-4.8 r0.225
  circle w0.45: c14.1,-3.6 r0.225
  circle w0.45: c14.1,-12 r0.225
Top Overlay:
  lines w0.15: -0.175,-21.05 -0.175,-21.35 14.625,-21.35 14.625,-21.05 ; -0.175,0.65 -0.175,0.95 14.625,0.95 14.625,0.65
  lines w0.2: -0.434,0.838 ccw(c-0.505,0.817) -0.431,0.81
3D body "ODIN-W160 3D-model.stp": height 3.1, standoff 0.18, extent -0.175,-21.35 14.625,0.95

## ODIN-W26 [mm] "ODIN-W262 WiFi/BT  module"
pads (103):
  rect 0.75x0.9 smd mask+0.05: A1(0,0) A2(0,-1.2) A3(0,-2.4) A4(0,-3.6) A5(0,-4.8) A6(0,-6) A7(0,-7.2) A8(0,-8.4) A9(0,-9.6) A10(0,-10.8) A11(0,-12) A12(0,-13.2) A13(0,-14.4) A14(0,-15.6) A15(0,-16.8) A16(0,-18) A17(0,-19.2) A18(0,-20.4) C1(14.45,-20.4) C2(14.45,-19.2) C3(14.45,-18) C4(14.45,-16.8) C5(14.45,-15.6) C6(14.45,-14.4) C7(14.45,-13.2) C8(14.45,-12) C9(14.45,-10.8) C10(14.45,-9.6) C11(14.45,-8.4) C12(14.45,-7.2) C13(14.45,-6) C14(14.45,-4.8) C15(14.45,-3.6) C16(14.45,-2.4) C17(14.45,-1.2) C18(14.45,0)
  rect 0.9x0.75 smd mask+0.05: B1(3.025,-21.175) B2(4.225,-21.175) B3(5.425,-21.175) B4(6.625,-21.175) B5(7.825,-21.175) B6(9.025,-21.175) B7(10.225,-21.175) B8(11.425,-21.175) D1(11.425,0.775) D2(10.225,0.775) D3(9.025,0.775) D4(7.825,0.775) D5(6.625,0.775) D6(5.425,0.775) D7(4.225,0.775) D8(3.025,0.775)
  round 0.8 smd mask+0.05: GND(1.525,-20.425) GND(1.525,-19.225) GND(1.525,-18.025) GND(1.525,-16.825) GND(3.025,-19.65) GND(3.025,-0.75) GND(4.225,-19.65) GND(4.225,-0.75) GND(5.425,-19.65) GND(5.425,-0.75) GND(5.685,-15.6) GND(5.685,-12) GND(5.685,-10.2) GND(5.685,-8.4) GND(5.685,-6.6) GND(6.525,-17.4) GND(6.625,-19.65) GND(6.625,-0.75) GND(7.225,-10.2) GND(7.225,-8.4) GND(7.225,-6.6) GND(7.825,-19.65) GND(7.825,-0.75) GND(7.925,-17.4) GND(8.765,-15.6) GND(8.765,-12) GND(8.765,-10.2) GND(8.765,-8.4) GND(8.765,-6.6) GND(9.025,-19.65) GND(9.025,-0.75) GND(10.225,-19.65) GND(10.225,-0.75) GND(11.425,-19.65) GND(11.425,-0.75) GND(12.925,-20.425) GND(12.925,-19.225) GND(12.925,-18.025) GND(12.925,-16.825) TP1(1.525,-12.7) TP2(12.925,-12.7) TP3(1.525,-10.16) TP4(12.925,-10.16) TP5(1.525,-7.62) TP6(12.925,-7.62) TP7(1.525,-5.08) TP8(12.925,-5.08) TP9(1.525,-2.54) TP10(12.925,-2.54) TP11(1.525,0) TP12(12.925,0)
Top Layer:
  circle w0.45: c0.375,0 r0.225
  circle w0.45: c0.375,-1.2 r0.225
  circle w0.45: c0.375,-2.4 r0.225
  circle w0.45: c0.375,-3.6 r0.225
  circle w0.45: c0.375,-4.8 r0.225
  circle w0.45: c0.375,-6 r0.225
  circle w0.45: c0.375,-7.2 r0.225
  circle w0.45: c0.375,-8.4 r0.225
  circle w0.45: c0.375,-9.6 r0.225
  circle w0.45: c0.375,-10.8 r0.225
  circle w0.45: c0.375,-12 r0.225
  circle w0.45: c0.375,-13.2 r0.225
  circle w0.45: c0.375,-14.4 r0.225
  circle w0.45: c0.375,-15.6 r0.225
  circle w0.45: c0.375,-16.8 r0.225
  circle w0.45: c0.375,-18 r0.225
  circle w0.45: c0.375,-19.2 r0.225
  circle w0.45: c0.375,-20.4 r0.225
  circle w0.45: c3.025,-20.8 r0.225
  circle w0.45: c4.225,-20.8 r0.225
  circle w0.45: c5.425,-20.8 r0.225
  circle w0.45: c6.625,-20.8 r0.225
  circle w0.45: c7.825,-20.8 r0.225
  circle w0.45: c9.025,-20.8 r0.225
  circle w0.45: c10.225,-20.8 r0.225
  circle w0.45: c11.425,-20.8 r0.225
  circle w0.45: c14.1,-20.4 r0.225
  circle w0.45: c14.1,-19.2 r0.225
  circle w0.45: c14.1,-18 r0.225
  circle w0.45: c14.1,-16.8 r0.225
  circle w0.45: c14.1,-15.6 r0.225
  circle w0.45: c14.1,-14.4 r0.225
  circle w0.45: c14.1,-13.2 r0.225
  circle w0.45: c14.1,-10.8 r0.225
  circle w0.45: c14.1,-9.6 r0.225
  circle w0.45: c14.1,-8.4 r0.225
  circle w0.45: c14.1,-7.2 r0.225
  circle w0.45: c14.1,0 r0.225
  circle w0.45: c14.1,-1.2 r0.225
  circle w0.45: c14.1,-2.4 r0.225
  circle w0.45: c11.425,0.425 r0.225
  circle w0.45: c10.225,0.425 r0.225
  circle w0.45: c9.025,0.425 r0.225
  circle w0.45: c7.825,0.425 r0.225
  circle w0.45: c6.625,0.425 r0.225
  circle w0.45: c5.425,0.425 r0.225
  circle w0.45: c4.225,0.425 r0.225
  circle w0.45: c3.025,0.425 r0.225
  circle w0.45: c14.1,-6 r0.225
  circle w0.45: c14.1,-4.8 r0.225
  circle w0.45: c14.1,-3.6 r0.225
  circle w0.45: c14.1,-12 r0.225
Top Overlay:
  lines w0.15: -0.175,-21.05 -0.175,-21.35 2.375,-21.35 ; -0.175,0.65 -0.175,0.95 2.375,0.95 ; 12.075,-21.35 14.625,-21.35 14.625,-21.05 ; 12.075,0.95 14.625,0.95 14.625,0.65
  lines w0.2: -0.434,0.838 ccw(c-0.505,0.817) -0.431,0.81
3D body "ODIN-W262 Module.stp": height 4.47, standoff -0.02, extent -0.175,-21.35 14.625,0.95

## PAM [mm] "u-blox PAM antenna module"
pads (10):
  oval 1.27x2.54 hole 0.9 paste-0.025: 1(-9.036,-9.876) 2(-6.496,-9.876) 3(-3.956,-9.876) 4(-1.416,-9.876) 5(1.124,-9.876) 6(3.664,-9.876) 7(6.204,-9.876) 8(8.744,-9.876)
  rect 2.5x2.5 smd paste-1.25: ""(-11.306,6.374) ""(11.204,6.374)
Top Layer:
  lines w0.254: -11.041,10.989 -10.991,10.989 ; 10.939,10.939 10.939,10.989
Top Overlay:
  lines w0.16: -11.036,4.799 -11.036,-11.001 -10.411,-11.001 ; -11.036,7.949 -11.036,10.999 10.964,10.999 10.964,7.949 ; 7.964,9.074 7.964,9.774 ; 7.964,9.149 7.964,8.699 9.039,8.699 9.039,-6.576 8.689,-6.926 8.195,-7.42 -8.292,-7.42 -9.111,-6.601 -9.111,8.949 -8.286,9.774 7.964,9.774 ; 10.089,-11.001 10.964,-11.001 10.964,4.799 ; 7.964,9.774 7.964,9.774
Mechanical 1:
  text "PAM" at -10.736,10.074 h0.6
  text "Samtec-TLW-108-06-G-S" at -10.261,-8.351 h0.6
Mechanical 13:
  text ".Designator" at -7.616,12.927 h1
Mechanical 15:
  lines w0.1: -1,0.01 -0.01,0.01 ; -0.01,-1 -0.01,0.01 ; -0.01,1 -0.01,0.01 ; 1,0.01 -0.01,0.01 ; -13.051,-11.751 -13.051,11.749 12.949,11.749 12.949,-11.751 -13.051,-11.751
3D body "PAM (STEP-AP214).STEP": height 7.66, standoff -0.04, extent -11.036,-11.001 10.964,10.999
3D body "Samtec-TLW-108-06-G-S (1).step": height 4.24, standoff -3.38, extent -10.311,-11.121 10.009,-8.632

## SAM-M8 [mm] "ublox SAM antenna module"
pads (20):
  rect 1.8x1.5 smd paste-1.8: 1(-6.6,3.8) 2(-6.6,1.9) 3(-6.6,0) 4(-6.6,-1.9) 5(-6.6,-3.8) 11(6.6,-3.8) 12(6.6,-1.9) 13(6.6,0) 14(6.6,1.9) 15(6.6,3.8)
  rect 1.5x1.8 smd paste-1.8: 6(-3.8,-6.6) 7(-1.9,-6.6) 8(0,-6.6) 9(1.9,-6.6) 10(3.8,-6.6) 16(3.8,6.6) 17(1.9,6.6) 18(0,6.6) 19(-1.9,6.6) 20(-3.8,6.6)
Top Overlay:
  circle w0.254: c-8.975,3.825 r0.127
  lines w0.1: -7.751,-7.775 -7.751,-0.024 -7.751,7.741 7.741,7.741 7.741,-0.009 7.741,-7.774 -0.001,-7.774 -7.75,-7.774
Top Paste:
  region: 7.467,-0.136 6.748,-0.136 6.748,-0.716 7.467,-0.716
  region: 7.463,0.701 6.744,0.701 6.744,0.121 7.463,0.121
  region: 6.449,-0.132 5.73,-0.132 5.73,-0.712 6.449,-0.712
  region: 6.449,0.698 5.73,0.698 5.73,0.118 6.449,0.118
  region: 7.467,-3.933 6.748,-3.933 6.748,-4.513 7.467,-4.513
  region: 7.463,-3.096 6.744,-3.096 6.744,-3.676 7.463,-3.676
  region: 6.449,-3.929 5.73,-3.929 5.73,-4.509 6.449,-4.509
  region: 6.449,-3.099 5.73,-3.099 5.73,-3.679 6.449,-3.679
  region: -5.731,-0.136 -6.45,-0.136 -6.45,-0.716 -5.731,-0.716
  region: -5.735,0.701 -6.454,0.701 -6.454,0.121 -5.735,0.121
  region: -6.749,-0.132 -7.468,-0.132 -7.468,-0.712 -6.749,-0.712
  region: -6.749,0.698 -7.468,0.698 -7.468,0.118 -6.749,0.118
  region: 4.499,6.75 4.499,7.469 3.919,7.469 3.919,6.75
  region: 3.669,6.75 3.669,7.469 3.089,7.469 3.089,6.75
  region: 4.502,5.736 4.502,6.455 3.922,6.455 3.922,5.736
  region: 3.665,5.732 3.665,6.451 3.085,6.451 3.085,5.732
  region: 0.703,6.75 0.703,7.469 0.123,7.469 0.123,6.75
  region: -0.127,6.75 -0.127,7.469 -0.707,7.469 -0.707,6.75
  region: 0.706,5.736 0.706,6.455 0.126,6.455 0.126,5.736
  region: -0.131,5.732 -0.131,6.451 -0.711,6.451 -0.711,5.732
  region: -3.103,6.75 -3.103,7.469 -3.683,7.469 -3.683,6.75
  region: -3.933,6.75 -3.933,7.469 -4.513,7.469 -4.513,6.75
  region: -3.1,5.736 -3.1,6.455 -3.68,6.455 -3.68,5.736
  region: -3.937,5.732 -3.937,6.451 -4.517,6.451 -4.517,5.732
  region: 4.5,-6.455 4.5,-5.736 3.92,-5.736 3.92,-6.455
  region: 3.67,-6.455 3.67,-5.736 3.09,-5.736 3.09,-6.455
  region: 4.503,-7.469 4.503,-6.75 3.923,-6.75 3.923,-7.469
  region: 3.666,-7.473 3.666,-6.754 3.086,-6.754 3.086,-7.473
  region: 1.77,-7.464 1.77,-6.745 1.19,-6.745 1.19,-7.464
  region: 2.607,-7.46 2.607,-6.741 2.027,-6.741 2.027,-7.46
  region: 1.774,-6.446 1.774,-5.727 1.194,-5.727 1.194,-6.446
  region: 2.604,-6.446 2.604,-5.727 2.024,-5.727 2.024,-6.446
  region: -3.932,-7.473 -3.932,-6.754 -4.512,-6.754 -4.512,-7.473
  region: -3.095,-7.469 -3.095,-6.75 -3.675,-6.75 -3.675,-7.469
  region: -3.928,-6.455 -3.928,-5.736 -4.508,-5.736 -4.508,-6.455
  region: -3.098,-6.455 -3.098,-5.736 -3.678,-5.736 -3.678,-6.455
  region: -1.198,-6.448 -1.198,-5.729 -1.778,-5.729 -1.778,-6.448
  region: -2.028,-6.448 -2.028,-5.729 -2.608,-5.729 -2.608,-6.448
  region: -1.195,-7.462 -1.195,-6.743 -1.775,-6.743 -1.775,-7.462
  region: -2.032,-7.466 -2.032,-6.747 -2.612,-6.747 -2.612,-7.466
  region: 0.708,-6.455 0.708,-5.736 0.128,-5.736 0.128,-6.455
  region: -0.122,-6.455 -0.122,-5.736 -0.702,-5.736 -0.702,-6.455
  region: 0.711,-7.469 0.711,-6.75 0.131,-6.75 0.131,-7.469
  region: -0.126,-7.473 -0.126,-6.754 -0.706,-6.754 -0.706,-7.473
  region: -2.027,5.723 -2.027,6.442 -2.607,6.442 -2.607,5.723
  region: -1.19,5.727 -1.19,6.446 -1.77,6.446 -1.77,5.727
  region: -2.023,6.741 -2.023,7.46 -2.603,7.46 -2.603,6.741
  region: -1.193,6.741 -1.193,7.46 -1.773,7.46 -1.773,6.741
  region: 1.76,5.728 1.76,6.447 1.18,6.447 1.18,5.728
  region: 2.597,5.732 2.597,6.451 2.017,6.451 2.017,5.732
  region: 1.764,6.746 1.764,7.465 1.184,7.465 1.184,6.746
  region: 2.594,6.746 2.594,7.465 2.014,7.465 2.014,6.746
  region: -5.731,3.674 -6.45,3.674 -6.45,3.094 -5.731,3.094
  region: -5.735,4.511 -6.454,4.511 -6.454,3.931 -5.735,3.931
  region: -6.749,3.678 -7.468,3.678 -7.468,3.098 -6.749,3.098
  region: -6.749,4.508 -7.468,4.508 -7.468,3.928 -6.749,3.928
  region: -6.749,2.603 -7.468,2.603 -7.468,2.023 -6.749,2.023
  region: -6.749,1.773 -7.468,1.773 -7.468,1.193 -6.749,1.193
  region: -5.735,2.606 -6.454,2.606 -6.454,2.026 -5.735,2.026
  region: -5.731,1.769 -6.45,1.769 -6.45,1.189 -5.731,1.189
  region: -6.749,-1.203 -7.468,-1.203 -7.468,-1.783 -6.749,-1.783
  region: -6.749,-2.033 -7.468,-2.033 -7.468,-2.613 -6.749,-2.613
  region: -5.735,-1.2 -6.454,-1.2 -6.454,-1.78 -5.735,-1.78
  region: -5.731,-2.037 -6.45,-2.037 -6.45,-2.617 -5.731,-2.617
  region: -6.749,-3.099 -7.468,-3.099 -7.468,-3.679 -6.749,-3.679
  region: -6.749,-3.929 -7.468,-3.929 -7.468,-4.509 -6.749,-4.509
  region: -5.735,-3.096 -6.454,-3.096 -6.454,-3.676 -5.735,-3.676
  region: -5.731,-3.933 -6.45,-3.933 -6.45,-4.513 -5.731,-4.513
  region: 6.449,-1.203 5.73,-1.203 5.73,-1.783 6.449,-1.783
  region: 6.449,-2.033 5.73,-2.033 5.73,-2.613 6.449,-2.613
  region: 7.463,-1.2 6.744,-1.2 6.744,-1.78 7.463,-1.78
  region: 7.467,-2.037 6.748,-2.037 6.748,-2.617 7.467,-2.617
  region: 6.449,2.603 5.73,2.603 5.73,2.023 6.449,2.023
  region: 6.449,1.773 5.73,1.773 5.73,1.193 6.449,1.193
  region: 7.463,2.606 6.744,2.606 6.744,2.026 7.463,2.026
  region: 7.467,1.769 6.748,1.769 6.748,1.189 7.467,1.189
  region: 6.453,4.499 5.734,4.499 5.734,3.919 6.453,3.919
  region: 6.453,3.669 5.734,3.669 5.734,3.089 6.453,3.089
  region: 7.467,4.502 6.748,4.502 6.748,3.922 7.467,3.922
  region: 7.471,3.665 6.752,3.665 6.752,3.085 7.471,3.085
Mechanical 13:
  text ".Designator" at -5.617,8.959 h1
Mechanical 15:
  lines w0.1: -0.8,0.017 0.028,0.017 ; 0.028,-0.8 0.028,0.017 ; 0.028,0.8 0.028,0.017 ; 0.8,0.017 0.028,0.017 ; -8.5,-8.5 -8.5,8.5 8.5,8.5 8.5,-8.5 -8.5,-8.5
3D body: height 6.8, standoff 0, extent -7.751,-7.775 7.749,7.741